# Altium integrated library Self made library.IntLib: 370 symbols (part 2 of 3) (continued)
## JTAG_ICE_CON_10P (continued)
JTAG for ATMEG128   Programmeur ATMEL ATMEGA128   Pinning:    1: TCK  (TCK venant du MuP)    2: GND    3: TDO  (TDO venant du MuP    4: VTref  (VCC = +5V)    5: TMS  (TMS venant du MuP)    6: sSRST  (RESET/ : RESET le MuP et les autres périphériques)    7: Vsupply  (VCC = +5V)    8: nTRST  (N.C. la plupart du temps)    9: TDI  (TDI venant du MuP)   10: GND; Manufacturer: 3M Electronic Solutions Division; Mounting Angle: Straight; Pitch: 2.54 mm; Digger CMP: CMP3585; Supplier 1: Mouser; RoHS: RoHS Compliant; Category: Headers & Wire Housings; Stock 1: 10932; Pricing 1: 1=1.64, 25=1.52, 50=1.47, 100=1.41, 200=1.28, 500=1.18, 1000=1.02, 2000=0.944 (CHF); Contact Plating: Gold; Number of Rows: 2 Row; Product: Headers; Series: 2500; Termination Style: Through Hole; Type: Shrouded; Brand: 3M Electronic Solutions Division; Mounting Style: -; Product Category: .100" Low Profile Box Headers; Standard Pack Qty: 50; RoHS - Mouser: Y; Minimum Order Quantity: 1; Reeling: False; ComponentLink1URL: http://www.mouser.com/ds/2/1/TS0770-34478.pdf; ComponentLink1Description: http://www.mouser.com/ds/2/1/TS0770-34478.pdf; Supplier Part Number 1: 517-N2510-6002RB
footprint JTAG_ICE_CON_10P
pins: 1 TCK, 2 GND_1, 3 TDO, 4 VTREF, 5 TMS, 6 NRESET, 7 VSUPPLY, 8 NTRST, 9 TDI, 10 GND_2

## JUMPER_1X2
designator ?, comment JUMPER 2x1 2.54mm
footprint JP2X1_254
pins: 1, 2

## L
designator ?, comment Inductance smd
footprint R0603
pins: 1, 2

## L5973DS0-8
designator U?, comment L5973D   2.5A switch step down switching regulator
footprint SO-8
pins: 1 OUT, 2 SYNC, 3 INH, 4 COMP, 5 FB, 6 VREF, 7 GND, 8 VCC

## L-USL4532C
designator L?, comment Inductance: 220 nH  (hidden comment: 200nH)
INDUCTOR, American symbol; Manufacturer: Bourns; Manufacturer Part Number: CM453232-R22ML; Maximum DC Current: 665 mA; Maximum DC Resistance: 250 mOhms; Self Resonant Frequency: 200 MHz; Shielding: Unshielded; Tolerance: 20 %; Type: SMT Chip Inductors; Case Height: 3.2 mm; Case Length: 4.5 mm; Digger CMP: CMP3572; Supplier 1: Mouser; RoHS: RoHS Compliant; Category: Fixed Inductors; Stock 1: 1071; Pricing 1: 1=0.298, 10=0.212, 100=0.182, 500=0.142, 1000=0.109, 2500=0.104 (CHF); Operating Temperature Range: - 40 C to + 100 C; Package/Case: 1812 (4532 metric); Packaging: Reel; Product: RF Inductors; Series: CM45, CM32, CM25, CM20, CM16, CM10; Termination Style: SMD/SMT; Brand: Bourns; Case Width: 3.2 mm; Product Category: Inductors; Standard Pack Qty: 500; RoHS - Mouser: Y; Minimum Order Quantity: 1; Reeling: True; ComponentLink1URL: http://www.mouser.com/ds/2/54/bourns_cm-322659.pdf; ComponentLink1Description: http://www.mouser.com/ds/2/54/bourns_cm-322659.pdf; Supplier Part Number 1: 652-CM453232-R22ML
footprint L4532M
pins: 1, 2

## L_0603_27nH
designator L?, comment Manufacturer Part Number 1: LQG18HN27NJ00D  (hidden comment: Inductance smd)
Manufacturer 1: Murata Electronics; Description 1: Inducteurs fixes 27 NH 5%; Matériau intérieur: Air; Bobinage: 27 nH; Courant CC max.: 300 mA; Résistance CC max.: 550 mOhms; Plage de températures de fonctionnement: - 55 C to + 125 C; Package/Boîte: 0603 (1608 metric); Conditionnement: Reel; Produit: RF Inductors; Q minimum: 12; Fréquence de résonance propre: 2000 MHz; Série: LQG; Style du raccordement: SMD/SMT; Tolérance: 5 %; Type: Multilayer Type Air Core Inductors/Coils; Hauteur du boîtier: 0.8 mm; Longueur du boîtier: 1.6 mm; Fabricant: Murata; Catégorie du produit: SMD Chip Inductors; Quantité standard du lot: 4000; Fréquence de test: 100 MHz; Supplier 1: Mouser; Supplier Part Number 1: 81-LQG18HN27NJ00D; RoHS: RoHS Compliant; Category: Inducteurs fixes; Stock 1: 8320; Pricing 1: 1=0.218, 10=0.151, 100=0.111, 1000=0.101, 4000=0.070, 8000=0.062, 24000=0.060, 100000=0.057 (CHF); Marque: Murata Electronics; Largeur du boîtier: 0.8 mm; RoHS - Mouser: Y; Minimum Order Quantity: 1; Reeling: True; ComponentLink1URL: http://www.mouser.com/ds/2/281/o05e-522697.pdf; ComponentLink1Description: http://www.mouser.com/ds/2/281/o05e-522697.pdf
footprint R0603
pins: 1, 2

## L_COOPER_DR_4.7UH
designator L?
footprint DR73
pins: P$1 1, P$2 2

## L_COOPER_DR_10UH
designator L?
footprint DR73
pins: P$1 1, P$2 2

## LAN_TRANSFORMER
designator T?, comment LAN Transformer   LAN Transformer for Ethernet.
MANUFACTURER: Wurth Electronics; MANUFACTURER_PART_NUMBER: 7490100110A; UNIT_PRICE: 0.07090; SUPPLIER: Wurth Electronics; SUPPLIER_PART_NUMBER: 7490100110A
footprint UL94-V0
pins: 1 RD+, 2 RCT, 3 RD-, 4 NC@1, 5 NC, 6 TD+, 7 TCT, 8 TD-, 9 TX-, 10 TXCT, 11 TX+, 12 NC@3, 13 NC@2, 14 RX-, 15 RXCT, 16 RX+

## LAN_TRANSFORMER749020100
designator T?, comment LAN Transformer   LAN Transformer for Ethernet.
footprint UL94-V0
pins: 1 RX+, 2 RX-, 3 RXCT, 4 NC, 5 NC@1, 6 TXCT, 7 TX+, 8 TX-, 9 TD-, 10 TD+, 11 TCT, 12 NC@2, 13 NC@3, 14 RCT, 15 RD-, 16 RD+

## LCL
designator ?
footprint LCL_NFE31P
pins: 1, 2, 3

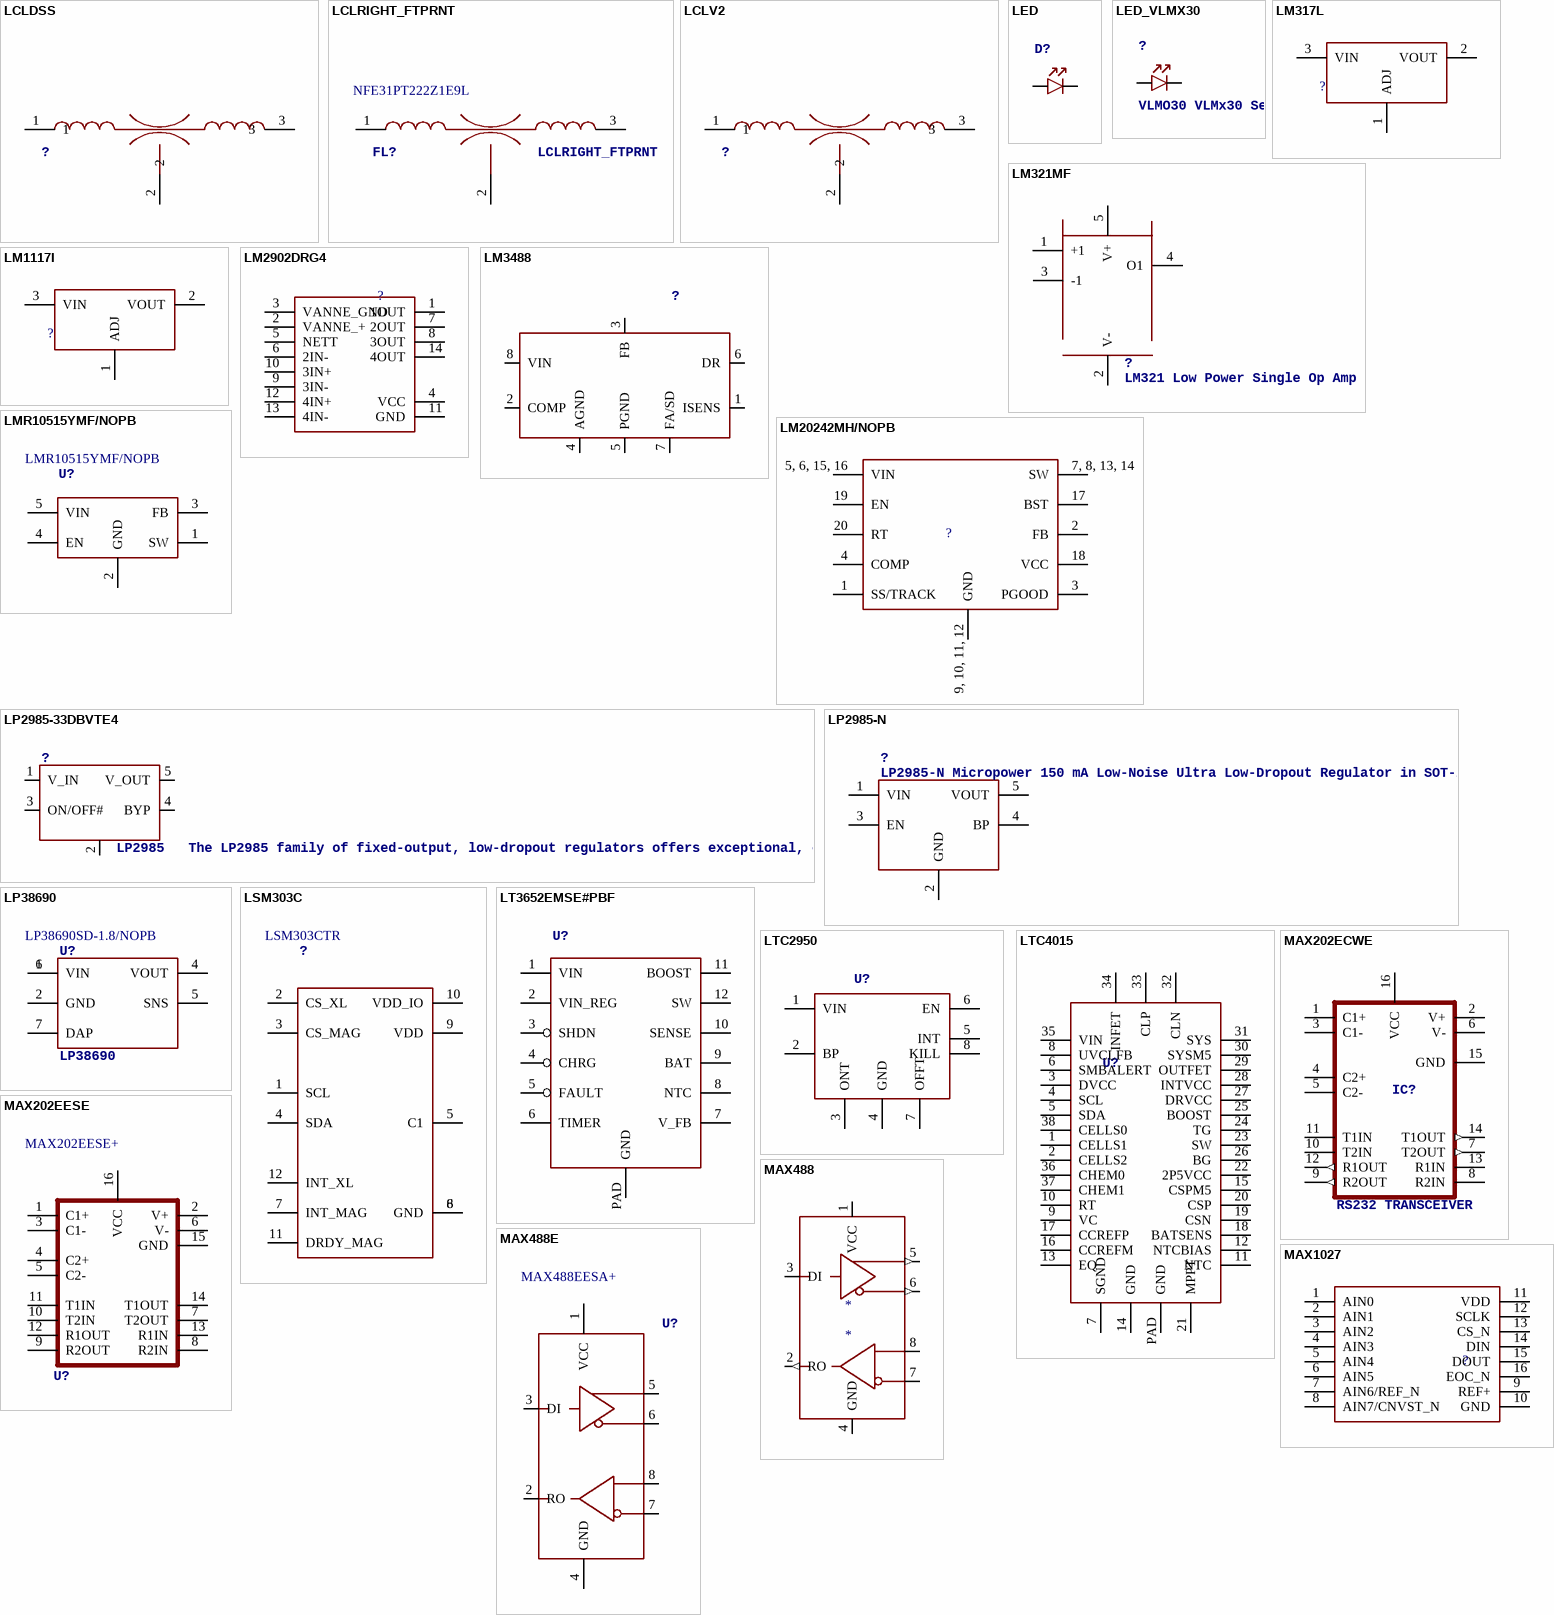
[diagram p12: symbols LCLDSS to MAX1027]

## LCLDSS
designator ?
footprint DSS_LCL
pins: 1, 2, 3

## LCLRIGHT_FTPRNT
designator FL?  Manufacturer Part Number: NFE31PT222Z1E9L
Manufacturer: Murata Electronics; Capacitance: 2200 pF; Current Rating: 6 A; Tolerance: 50 %; Voltage Rating DC: 25 V; Ground Terminal: 1 mm; Case Height: 1.6 mm; Case Length: 3.2 mm; Insulation Resistance: 1000 MOhms; Digger CMP: CMP4453; Supplier 1: Mouser; RoHS: RoHS Compliant; Category: Feed Through Capacitors; Stock 1: 29583; Pricing 1: 1=0.586, 10=0.372, 100=0.294, 500=0.276, 1000=0.233, 2000=0.213, 4000=0.196 (CHF); Frequency Range: -; Package/Case: 1206 (3216 metric); Packaging: Reel; Product: Three Terminal Network Filter Capacitors; Series: NFE; Termination Style: SMD/SMT; Type: Chip Capacitor Block LC Combined Type; Brand: Murata Electronics; Case Width: 1.6 mm; Maximum Operating Temperature: + 85 C; Minimum Operating Temperature: - 40 C; Product Category: SMD EMI Filters/Chip Ferrite Beads; Standard Pack Qty: 2000; Tradename: EMIFIL; RoHS - Mouser: Y; Minimum Order Quantity: 1; Reeling: True; ComponentLink1URL: http://www.mouser.com/ds/2/281/L0112S0113NFE31P-339750.pdf; ComponentLink1Description: http://www.mouser.com/ds/2/281/L0112S0113NFE31P-339750.pdf; Supplier Part Number 1: 81-NFE31PT222Z1E9L
footprint LCL_NFE31P_GOOD_STENCIL
pins: 1, 2, 2a, 2b, 3

## LCLV2
designator ?
footprint LCL_NFE31P_V2
pins: 1, 2, 3

## LED
designator D?
footprint 1206
pins: 1 A, 2 C

## LED_VLMX30
designator ?, comment VLMO30 VLMx30 Series   Low Current SMD LED; 1.8V .. 2.2V; 2mA
footprint VLMX30
pins: A, K C

## LM317L
designator ?
footprint CON3P_1.5MM2
pins: 1 ADJ, 2 VOUT, 3 VIN

## LM321MF
designator ?, comment LM321 Low Power Single Op Amp
MANUFACTURER: Texas Instruments; MANUFACTURER_PART_NUMBER: LM321MF/NOPB; UNIT_PRICE: 0.687; SUPPLIER: mouser; SUPPLIER_PART_NUMBER: 926-LM321MF/NOPB
footprint SOT-23-5
pins: 1 +1, 2 V-, 3 -1, 4 O1, 5 V+

## LM1117I
designator ?
footprint CON3P_1.5MM2
pins: 1 ADJ, 2 VOUT, 3 VIN

## LM2902DRG4
designator ?
footprint SOP14
pins: 1 1OUT, 2 VANNE_+, 3 VANNE_GND, 4 VCC, 5 NETT, 6 2IN-, 7 2OUT, 8 3OUT, 9 3IN-, 10 3IN+, 11 GND, 12 4IN+, 13 4IN-, 14 4OUT

## LM3488
designator ?
footprint VSSOP8
pins: 1 ISENS, 2 COMP, 3 FB, 4 AGND, 5 PGND, 6 DR, 7 FA/SD, 8 VIN

## LM20242MH/NOPB
designator ?
footprint SSOP20
pins: 1 SS/TRACK, 2 FB, 3 PGOOD, 4 COMP, 5, 6, 15, 16 VIN, 7, 8, 13, 14 SW, 9, 10, 11, 12 GND, 17 BST, 18 VCC, 19 EN, 20 RT

## LMR10515YMF/NOPB
designator U?, comment Manufacturer Part Number 1: LMR10515YMF/NOPB  (hidden comment: LMR10515 SIMPLE SWITCHER ® 5.5Vin, 1.5A Step-Down Voltage Regulator)
MANUFACTURER: Texas Instruments; UNIT_PRICE: 0.834; Description 1: Régulateurs de tension - Régulateurs de commutation SIMPLE SWITCHER 5.5 Vin,1.5A SD Vltg Reg; Tension d'entrée max.: 5.5 V; Tension de sortie: 600 mV to 4.5 V; Package/Boîte: SOT-23-5; Conditionnement: Reel; Style de montage: SMD/SMT; Fréquence de commutation: 3 MHz; Topologie: Buck; Kit de développement: LMR10515YSDDEMO/NOPB; Tension d'entrée MIN: 3 V; Température de fonctionnement max.: + 85 C; Température de fonctionnement min.: - 40 C; Quantité standard du lot: 1000; MANUFACTURER_PART_NUMBER: LMR10515YMF/NOPB; SUPPLIER: mouser; SUPPLIER_PART_NUMBER: 926-LMR10515YMF/NOPB; Supplier 1: Mouser; Supplier Part Number 1: 926-LMR10515YMF/NOPB; Manufacturer 1: Texas Instruments; RoHS: RoHS Compliant; Category: Régulateurs de tension - Régulateurs de commutation; Stock 1: 901; Pricing 1: 1=1.07, 10=0.950, 25=0.862, 50=0.798, 100=0.755, 250=0.644, 500=0.569, 750=0.497, 1000=0.385 (CHF); Courant de sortie: 1.5 A; Série: LMR10515; Type: Step Down; Marque: Texas Instruments; Fabricant: Texas Instruments; RoHS - Mouser: Y; Minimum Order Quantity: 1; Reeling: True; ComponentLink1URL: http://www.mouser.com/ds/2/405/lmr10515-524697.pdf; ComponentLink1Description: http://www.mouser.com/ds/2/405/lmr10515-524697.pdf
footprint SOT-23-5
pins: 1 SW, 2 GND, 3 FB, 4 EN, 5 VIN

## LP2985-33DBVTE4
designator ?, comment LP2985   The LP2985 family of fixed-output, low-dropout regulators offers exceptional, cost-effective performance for both portable and nonportable applications. Available in voltages of 1.8 V, 2.8 V, 2.9 V, 3 V, 3.3 V and 5 V, the family has an output tolerance of 1% for the A version (1.5% for the non-A version) and is capable of delivering 150-mA continuous load current. Standard regulator features, such as overcurrent and overtemperature protection, are included.
footprint SOT-23-5
pins: 1 V_IN, 2 GND, 3 ON/OFF#, 4 BYP, 5 V_OUT

## LP2985-N
designator ?, comment LP2985-N Micropower 150 mA Low-Noise Ultra Low-Dropout Regulator in SOT-23
MANUFACTURER: Texas Instruments; MANUFACTURER_PART_NUMBER: LP2985AIM5-4.5/NOPB; UNIT_PRICE: 0.863; SUPPLIER: mouser; SUPPLIER_PART_NUMBER: 926-LP2985AIM545NOPB
footprint SOT-23-5
pins: 1 VIN, 2 GND, 3 EN, 4 BP, 5 VOUT

## LP38690
designator U?  Manufacturer Part Number 1: LP38690SD-1.8/NOPB
MANUFACTURER: Texas Instruments; UNIT_PRICE: 1.80; Description 1: Régulateurs de tension LDO 1A LDO CMOS Linear Reg; Courant de polarisation d’entrée maximal: 55 uA; Tension d'entrée max.: 10 V; Nombre de sorties: 1 Output; Courant de sortie: 1 A; Type de sortie: Fixed; Tension de sortie: 1.8 V; Package/Boîte: WSON-6; Conditionnement: Reel; Produit: Low Dropout CMOS Linear Regulator; Tension de décrochage maximale: 1.6 V at 1 A; Style de montage: SMD/SMT; Tolérance de la tension de sortie: 2.5 %; Taux de réjection d’alimentation / d'ondulation standard: 55 dB; Précision de la régulation de la tension: +/- 2.5 %; Tension d'entrée MIN: 2.7 V; Régulation de la ligne: 0.03 %/V; Régulation de la charge: 1.8 %/A; Température de fonctionnement max.: + 125 C; Température de fonctionnement min.: - 40 C; Quantité standard du lot: 1000; MANUFACTURER_PART_NUMBER: LP38690SD-1.8/NOPB; SUPPLIER: Mouser; SUPPLIER_PART_NUMBER: 926-38690SD-1.8/NOPB; Supplier 1: Mouser; Supplier Part Number 1: 926-38690SD-1.8/NOPB; Manufacturer 1: Texas Instruments; RoHS: RoHS Compliant; Category: Régulateurs de tension LDO; Stock 1: 266; Pricing 1: 1=1.64, 10=1.45, 25=1.30, 50=1.21, 100=1.14, 250=0.969, 500=0.861, 750=0.753, 1000=0.583 (CHF); Série: LP38690; Type: Low Dropout Linear Regulator; Marque: Texas Instruments; Fabricant: Texas Instruments; RoHS - Mouser: Y; Minimum Order Quantity: 1; Reeling: True; ComponentLink1URL: http://www.mouser.com/ds/2/405/lp38690-484037.pdf; ComponentLink1Description: http://www.mouser.com/ds/2/405/lp38690-484037.pdf
footprint WSON6PIN
pins: 1 VIN, 2 GND, 4 VOUT, 5 SNS, 6 VIN, 7 DAP

## LSM303C
designator ?, comment Manufacturer Part Number 1: LSM303CTR  (hidden comment: Ultra-compact high-performance e-compass 3D accelerometer and 3D magnetometer module)
MANUFACTURER: STMicroelectronics; UNIT_PRICE: 3.02; Description 1: Accéléromètres Ultra-compact High performance 3D accel; Interface: I2C, SPI; Type de sortie: Digital; Package/Boîte: LGA-12; Conditionnement: Reel; Résolution: 16 bit; Série: LSM303C; Accélération: 2 g, 4 g, 8 g; Style de montage: SMD/SMT; Axe de détection: Triple; Température de fonctionnement max.: + 85 C; Température de fonctionnement min.: - 40 C; Quantité standard du lot: 8000; Tension d’alimentation - Max.: 3.6 V; Tension d’alimentation - Min.: 1.9 V; Product Status: New Product; MANUFACTURER_PART_NUMBER: LSM303CTR; SUPPLIER: mouser; SUPPLIER_PART_NUMBER: 511-LSM303CTR; Supplier 1: Mouser; Supplier Part Number 1: 511-LSM303CTR; Manufacturer 1: STMicroelectronics; RoHS: RoHS Compliant; Category: Accéléromètres; Stock 1: 4788; Pricing 1: 1=2.75, 10=2.22, 100=1.77, 500=1.55, 1000=1.28, 2500=1.20, 5000=1.16, 8000=1.14 (CHF); Marque: STMicroelectronics; Fabricant: STMicroelectronics; RoHS - Mouser: Y; Minimum Order Quantity: 1; Reeling: True; ComponentLink1URL: http://www.mouser.com/ds/2/389/DM00089896-491732.pdf; ComponentLink1Description: http://www.mouser.com/ds/2/389/DM00089896-491732.pdf
footprint LSM303C
pins: 1 SCL, 2 CS_XL, 3 CS_MAG, 4 SDA, 5 C1, 6 GND, 7 INT_MAG, 8 GND, 9 VDD, 10 VDD_IO, 11 DRDY_MAG, 12 INT_XL

## LT3652EMSE#PBF
designator U?
footprint MSOP-12_EXPOSED_PAD
pins: 1 VIN, 2 VIN_REG, 3 SHDN, 4 CHRG, 5 FAULT, 6 TIMER, 7 V_FB, 8 NTC, 9 BAT, 10 SENSE, 11 BOOST, 12 SW, PAD GND

## LTC2950
designator U?  (value not drawn)
footprint TSOT-23 (TSOP, 8-Leads, Body 2.90x1.63mm, Pitch 0.65mm, IPC Medium Density)
pins: 1 VIN, 2 BP, 3 ONT, 4 GND, 5 INT, 6 EN, 7 OFFT, 8 KILL

## LTC4015
designator U?
footprint QFN38_5mmx7mm (QFN, 38-Leads, Body 5.05x7.05mm, Pitch 0.50mm, Thermal Pad 3.15x5.15mm, IPC Medium Density)
pins: 1 CELLS1, 2 CELLS2, 3 DVCC, 4 SCL, 5 SDA, 6 SMBALERT, 7 SGND, 8 UVCLFB, 9 VC, 10 RT, 11 NTC, 12 NTCBIAS, 13 EQ, 14 GND, 15 CSPM5, 16 CCREFM, 17 CCREFP, 18 BATSENS, 19 CSN, 20 CSP, 21 MPPT, 22 2P5VCC, 23 SW, 24 TG, 25 BOOST, 26 BG, 27 DRVCC, 28 INTVCC, 29 OUTFET, 30 SYSM5, 31 SYS, 32 CLN, 33 CLP, 34 INFET, 35 VIN, 36 CHEM0, 37 CHEM1, 38 CELLS0, PAD GND

## MAX202ECWE
designator IC?, comment RS232 TRANSCEIVER
MPN: MAX202ECWE+T; OC_FARNELL: 9724419; OC_NEWARK: 67K4364
footprint SO16
pins: 1 C1+, 2 V+, 3 C1-, 4 C2+, 5 C2-, 6 V-, 7 T2OUT (out), 8 R2IN, 9 R2OUT (out), 10 T2IN, 11 T1IN, 12 R1OUT (out), 13 R1IN, 14 T1OUT (out), 15 GND (power), 16 VCC (power)

## MAX202EESE
designator U?  Manufacturer Part Number: MAX202EESE+  (hidden comment: MAX202EESE)
±15kV ESD-Protected, +5V RS-232 Transceivers; Manufacturer: Maxim Integrated; Data Rate: 120 kb/s; Propagation Delay Time ns: 10 us; Supply Current: 15 mA; Shutdown: Without Shutdown; Number of Drivers: 2 Driver; Number of Receivers: 2 Receiver; Operating Supply Voltage: 5 V; Digger CMP: CMP3181; Supplier 1: Mouser; RoHS: RoHS Compliant; Category: RS-232 Interface IC; Stock 1: 1023; Pricing 1: 1=4.07, 25=3.65, 50=3.61, 100=3.52, 250=3.50, 1000=3.48, 2000=3.43 (CHF); Function: Transceiver; Package/Case: SO-16 Narrow; Packaging: Tube; Series: MAX202E; Brand: Maxim Integrated; Mounting Style: SMD/SMT; Maximum Operating Temperature: + 85 C; Minimum Operating Temperature: - 40 C; Standard Pack Qty: 50; RoHS - Mouser: Y; Minimum Order Quantity: 1; Reeling: False; ComponentLink1URL: http://datasheets.maxim-ic.com/en/ds/MAX202E-MAX241E.pdf; ComponentLink1Description: http://datasheets.maxim-ic.com/en/ds/MAX202E-MAX241E.pdf; Supplier Part Number 1: 700-MAX202EESE
footprint SO16
pins: 1 C1+, 2 V+, 3 C1-, 4 C2+, 5 C2-, 6 V-, 7 T2OUT, 8 R2IN, 9 R2OUT, 10 T2IN, 11 T1IN, 12 R1OUT, 13 R1IN, 14 T1OUT, 15 GND (power), 16 VCC (power)

## MAX488
designator *
footprint SO08
pins: 1 VCC (power), 2 RO (out), 3 DI, 4 GND (power), 5 Y (out), 6 Z (out), 7 B, 8 A

## MAX488E
designator U?  Manufacturer Part Number: MAX488EESA+  (hidden comment: MAX488E)
1/- 15KV ESD Protected Low-Power RS485 transceiver; Manufacturer: Maxim Integrated; Data Rate: 256 kb/s; Input Voltage: 0.8 V to 2 V; Output Voltage: 3 V; Propagation Delay Time ns: 250 ns; Supply Current: 120 uA; Duplex: Full Duplex; Maximum Power Dissipation: 471 mW; Number of Drivers: 1 Driver; Number of Receivers: 1 Receiver; Operating Supply Voltage: 5 V; Digger CMP: CMP4457; Supplier 1: Mouser; RoHS: RoHS Compliant; Category: RS-422/RS-485 Interface IC; Stock 1: 546; Pricing 1: 1=3.51, 25=3.15, 50=3.12, 250=3.11, 500=3.05, 1000=3.00 (CHF); Function: Transceiver; Operating Temperature Range: - 40 C to + 85 C; Package/Case: SOIC-8; Packaging: Tube; Series: MAX488E; Brand: Maxim Integrated; Mounting Style: SMD/SMT; Maximum Operating Temperature: + 85 C; Minimum Operating Temperature: - 40 C; Standard Pack Qty: 100; RoHS - Mouser: Y; Minimum Order Quantity: 1; Reeling: False; ComponentLink1URL: http://www.mouser.com/ds/2/256/MAX1487E-MAX491E-101921.pdf; ComponentLink1Description: http://www.mouser.com/ds/2/256/MAX1487E-MAX491E-101921.pdf; Supplier Part Number 1: 700-MAX488EESA
footprint SO08
pins: 1 VCC, 2 RO, 3 DI, 4 GND, 5 Y, 6 Z, 7 B, 8 A

## MAX1027
designator ?
footprint QSOP16
pins: 1 AIN0, 2 AIN1, 3 AIN2, 4 AIN3, 5 AIN4, 6 AIN5, 7 AIN6/REF_N, 8 AIN7/CNVST_N, 9 REF+, 10 GND, 11 VDD, 12 SCLK, 13 CS_N, 14 DIN, 15 DOUT, 16 EOC_N

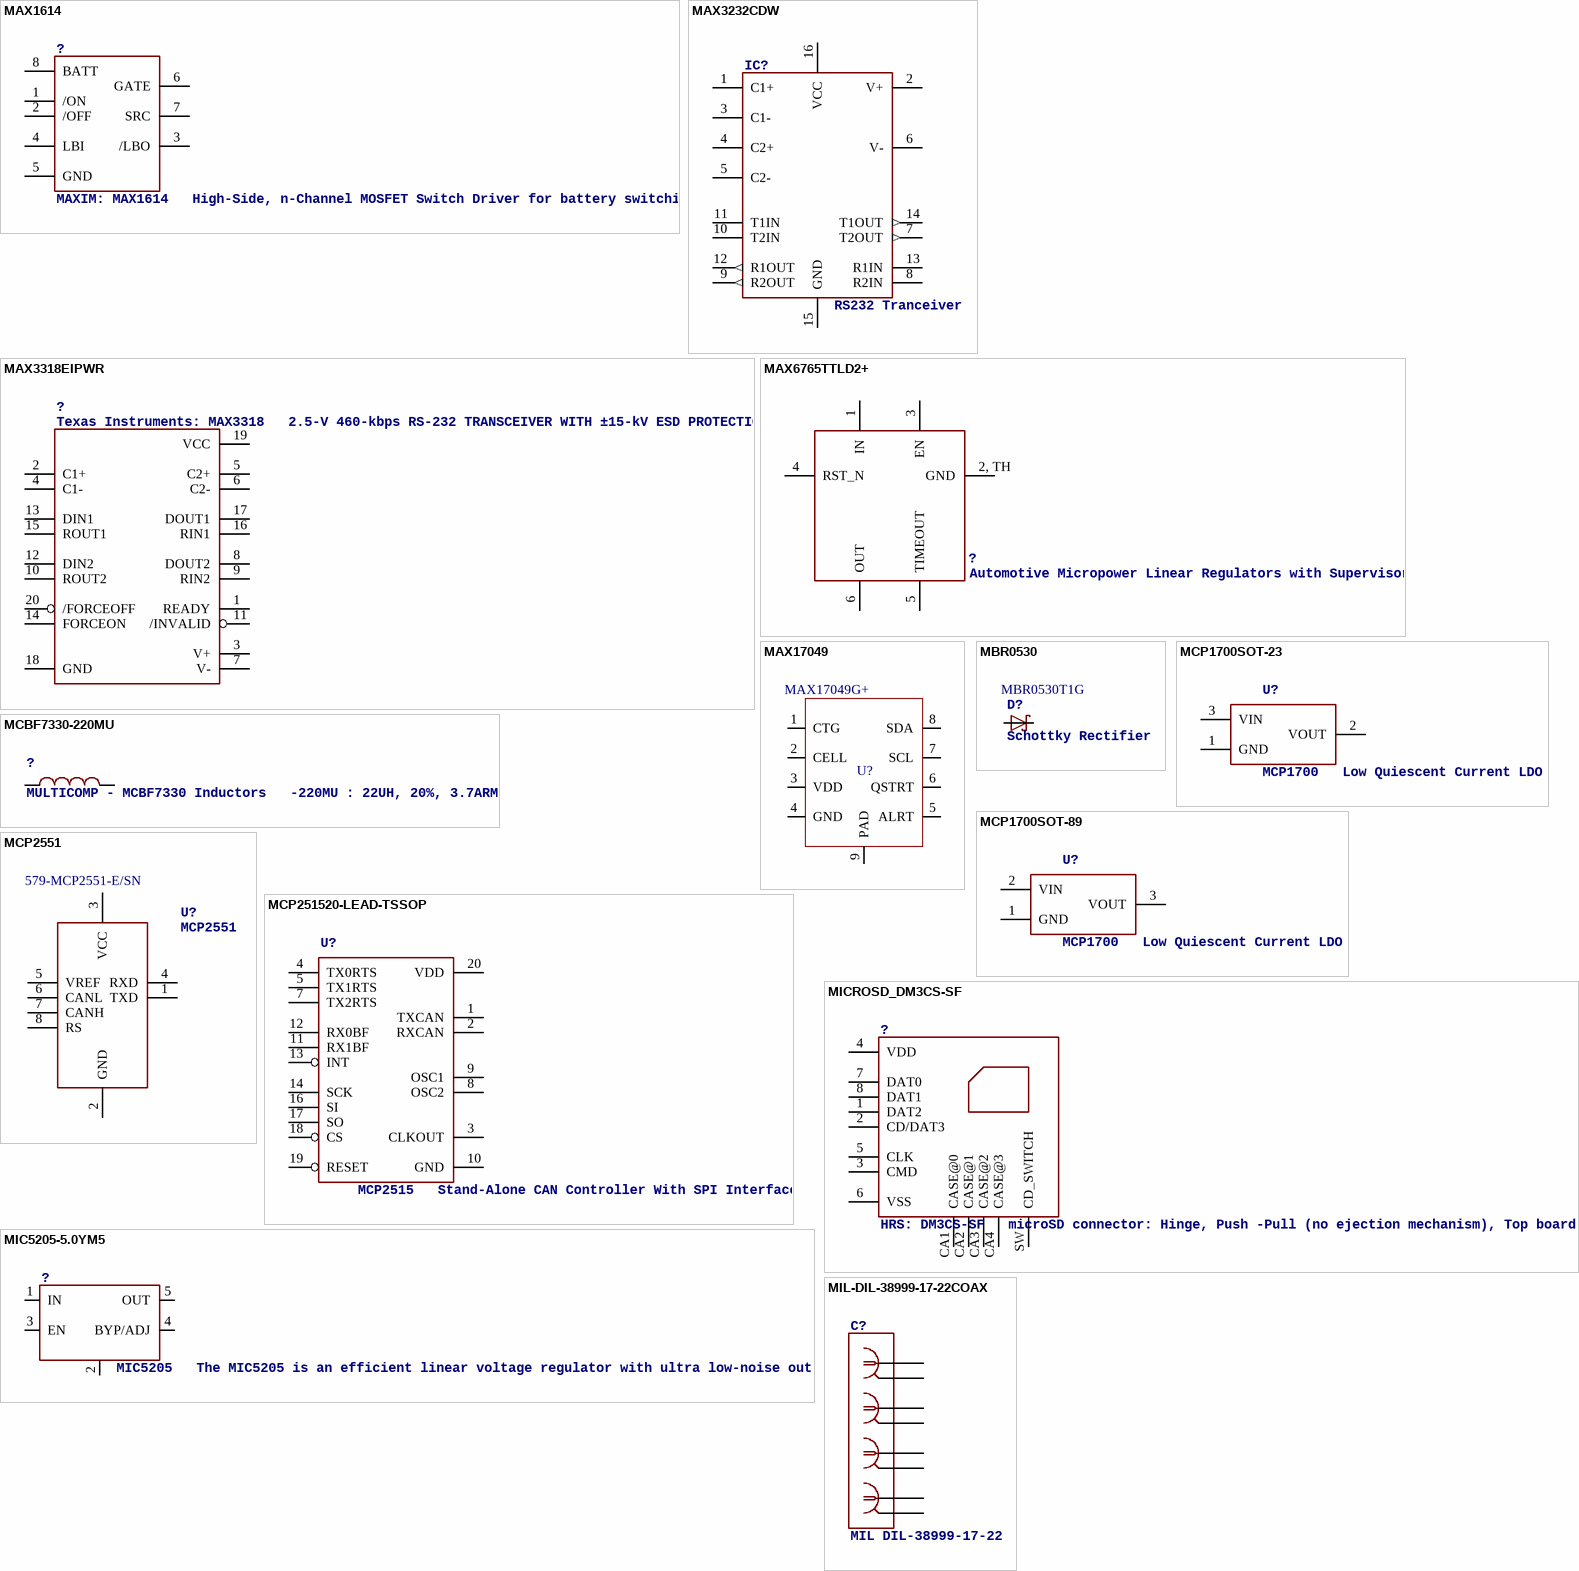
[diagram p13: symbols MAX1614 to MIL-DIL-38999-17-22COAX]

## MAX1614
designator ?, comment MAXIM: MAX1614   High-Side, n-Channel MOSFET Switch Driver for battery switching
footprint U_MAX8
pins: 1 /ON, 2 /OFF, 3 /LBO, 4 LBI, 5 GND, 6 GATE, 7 SRC, 8 BATT